# Altium integrated library Lib31082020.IntLib: 205 symbols (part 2 of 2)
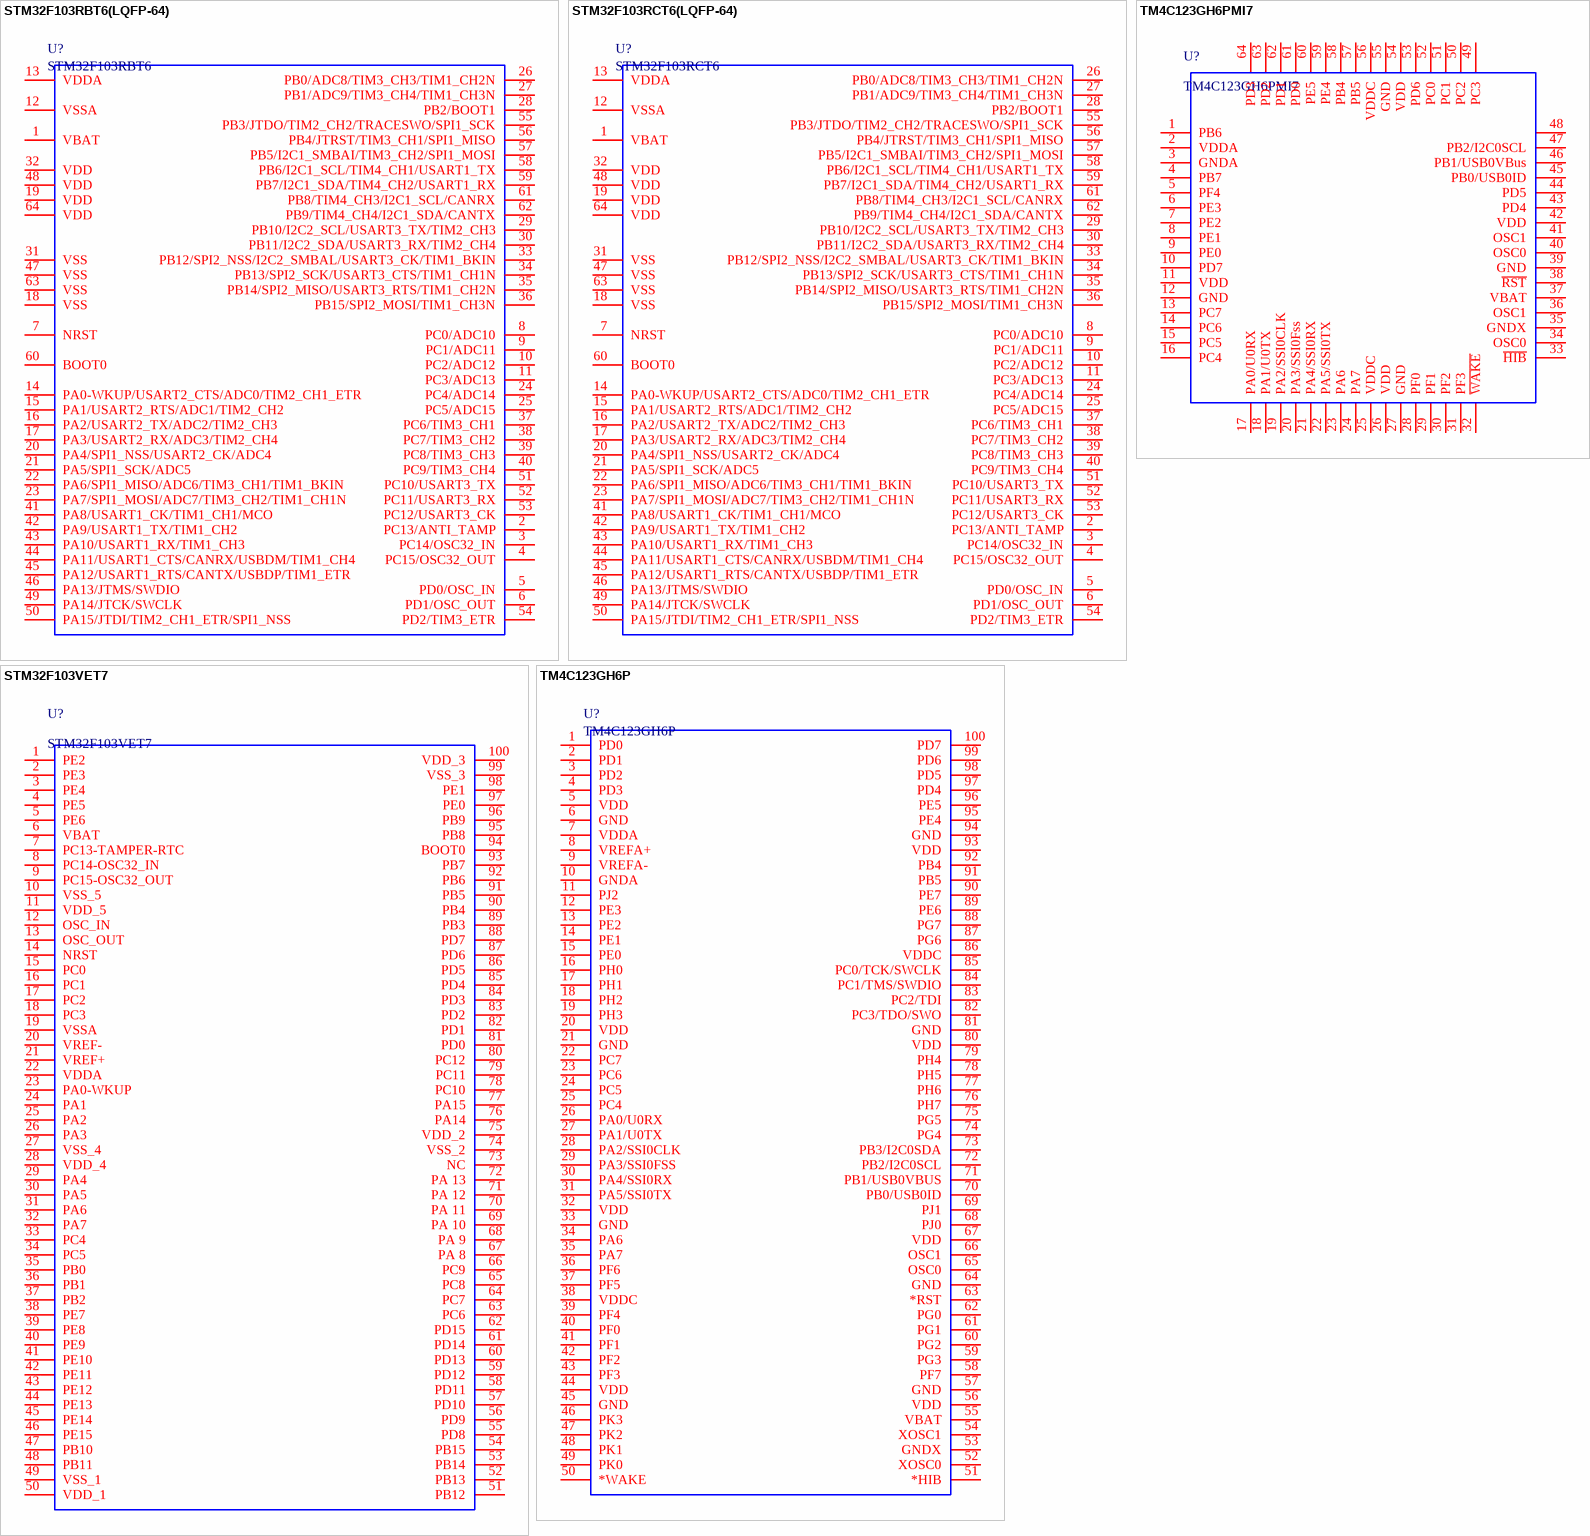
[diagram p17: symbols STM32F103RBT6(LQFP-64) to TM4C123GH6PMI7]

## TM4C123GH6PMI7
designator U?
footprint SOCKET-ADAPTER-OTQ-64-05-03
pins: 1 PB6, 2 VDDA, 3 GNDA, 4 PB7, 5 PF4, 6 PE3, 7 PE2, 8 PE1, 9 PE0, 10 PD7, 11 VDD, 12 GND, 13 PC7, 14 PC6, 15 PC5, 16 PC4, 17 PA0/U0RX, 18 PA1/U0TX, 19 PA2/SSI0CLK, 20 PA3/SSI0Fss, 21 PA4/SSI0RX, 22 PA5/SSI0TX, 23 PA6, 24 PA7, 25 VDDC, 26 VDD, 27 GND, 28 PF0, 29 PF1, 30 PF2, 31 PF3, 32 ~{WAKE}, 33 ~{HIB}, 34 OSC0, 35 GNDX, 36 OSC1, 37 VBAT, 38 ~{RST}, 39 GND, 40 OSC0, 41 OSC1, 42 VDD, 43 PD4, 44 PD5, 45 PB0/USB0ID, 46 PB1/USB0VBus, 47 PB2/I2C0SCL, 48  , 49 PC3, 50 PC2, 51 PC1, 52 PC0, 53 PD6, 54 VDD, 55 GND, 56 VDDC, 57 PB5, 58 PB4, 59 PE4, 60 PE5, 61 PD0, 62 PD1, 63 PD2, 64 PD3